# Altium footprint library SMT.PcbLib: 379 footprints (part 5 of 24)
Each footprint in its own frame and in the unit in brackets; x right, y up, seen from the top. Pads: shape width x height; smd on the part's side, far side on the other; paste and mask are expansions set on the pad; w line width, h text height; cw(c..) or ccw(c..) is an arc to the next point about the centre after c.
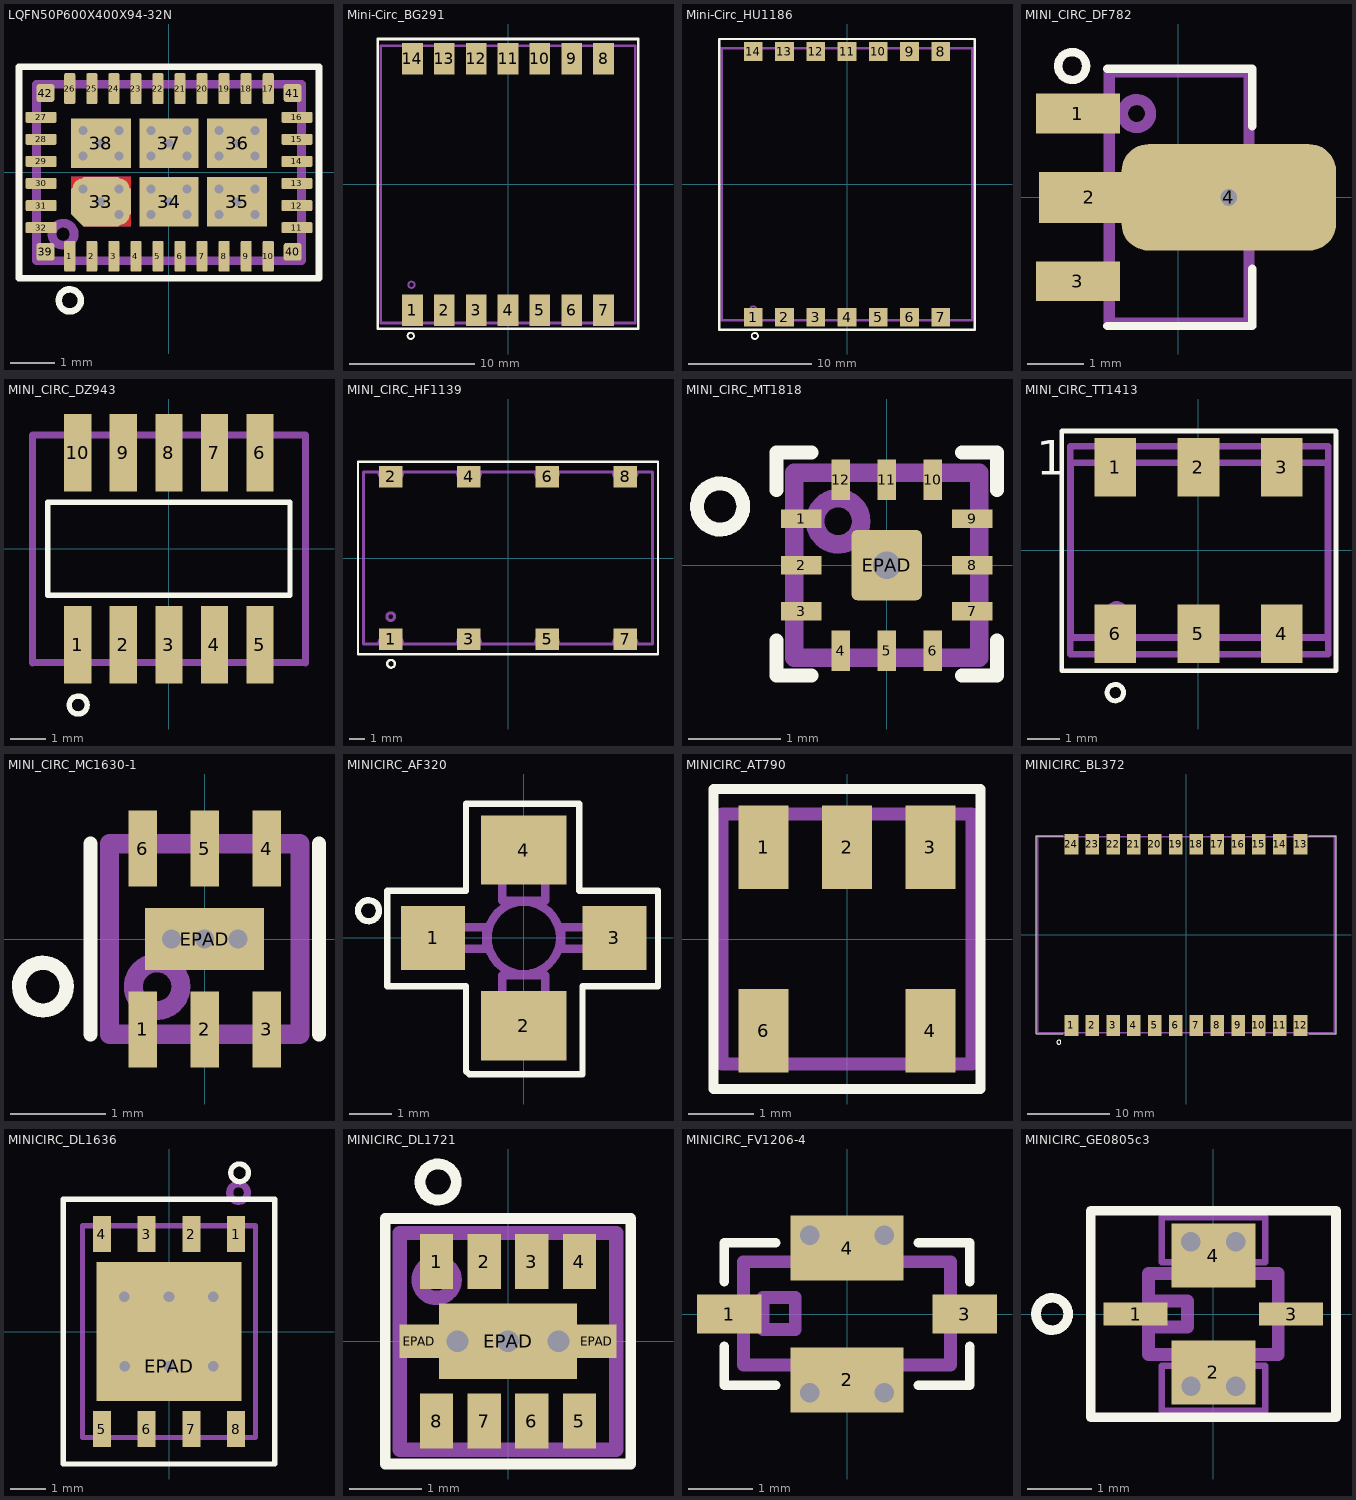
[diagram p4: the footprints below, top view; thin cyan lines are the x and y axes]

## LQFN50P600X400X94-32N [mm] "32-Lead SMD; Body: L=6mm, W=4mm, H=0.94mm; Weight: ~2g"
height 1.03
pads (42):
  rrect25% 0.25x0.7 smd paste+0 mask+0.05: 1(-2.25,-1.9) 2(-1.75,-1.9) 3(-1.25,-1.9) 4(-0.75,-1.9) 5(-0.25,-1.9) 6(0.25,-1.9) 7(0.75,-1.9) 8(1.25,-1.9) 9(1.75,-1.9) 10(2.25,-1.9) 17(2.25,1.9) 18(1.75,1.9) 19(1.25,1.9) 20(0.75,1.9) 21(0.25,1.9) 22(-0.25,1.9) 23(-0.75,1.9) 24(-1.25,1.9) 25(-1.75,1.9) 26(-2.25,1.9)
  rrect25% 0.7x0.25 smd paste+0 mask+0.05: 11(2.9,-1.25) 12(2.9,-0.75) 13(2.9,-0.25) 14(2.9,0.25) 15(2.9,0.75) 16(2.9,1.25) 27(-2.9,1.25) 28(-2.9,0.75) 29(-2.9,0.25) 30(-2.9,-0.25) 31(-2.9,-0.75) 32(-2.9,-1.25)
  oct 1.355x1.125 hole 0.2 paste+0 mask+0.04: 33(-1.543,-0.663)
  rect 1.33x1.125 hole 0.2 paste+0 mask+0.04: 34(0,-0.663) 37(0,0.663)
  rect 1.355x1.125 hole 0.2 paste+0 mask+0.04: 35(1.542,-0.663) 36(1.543,0.663) 38(-1.542,0.663)
  rrect25% 0.4x0.4 smd paste+0 mask+0.05: 39(-2.8,-1.8) 40(2.8,-1.8) 41(2.8,1.8) 42(-2.8,1.8)
via -1.95,0.95 diameter 0.48 hole 0.2
via -1.135,0.95 diameter 0.48 hole 0.2
via -1.135,0.375 diameter 0.48 hole 0.2
via -1.95,0.375 diameter 0.48 hole 0.2
via -0.408,0.375 diameter 0.48 hole 0.2
via 0.408,0.375 diameter 0.48 hole 0.2
via 0.408,0.95 diameter 0.48 hole 0.2
via -0.408,0.95 diameter 0.48 hole 0.2
via 1.135,0.375 diameter 0.48 hole 0.2
via 1.95,0.375 diameter 0.48 hole 0.2
via 1.95,0.95 diameter 0.48 hole 0.2
via 1.135,0.95 diameter 0.48 hole 0.2
via 1.135,-0.95 diameter 0.48 hole 0.2
via 1.95,-0.95 diameter 0.48 hole 0.2
via 1.95,-0.375 diameter 0.48 hole 0.2
via 1.135,-0.375 diameter 0.48 hole 0.2
via -0.408,-0.95 diameter 0.48 hole 0.2
via 0.408,-0.95 diameter 0.48 hole 0.2
via 0.408,-0.375 diameter 0.48 hole 0.2
via -0.408,-0.375 diameter 0.48 hole 0.2
via -1.135,-0.95 diameter 0.48 hole 0.2
via -1.135,-0.375 diameter 0.48 hole 0.2
via -1.95,-0.375 diameter 0.48 hole 0.2
Top Layer:
  region: -2.22,-0.945 -2.22,-0.1 -0.865,-0.1 -0.865,-1.225 -1.94,-1.225
Bottom Layer:
  region: -2.22,-0.945 -2.22,-0.1 -0.865,-0.1 -0.865,-1.225 -1.94,-1.225
  region: -2.22,-0.945 -2.22,-0.1 -0.865,-0.1 -0.865,-1.225 -1.94,-1.225
Top Overlay:
  circle w0.15: c-2.25,-2.9 r0.25
  lines w0.15: -3.4,-2.4 -3.4,2.4 3.4,2.4 3.4,-2.4 -3.4,-2.4
Top Paste:
  region: 0.87,0.1 0.865,0.105 0.865,1.225 2.22,1.225 2.22,0.1
  region: 0.87,-1.225 0.865,-1.22 0.865,-0.1 2.22,-0.1 2.22,-1.225
  region: -1.94,-1.225 -2.22,-0.945 -2.22,-0.1 -0.865,-0.1 -0.865,-1.225
  region: -0.665,1.225 0.665,1.225 0.665,0.1 -0.665,0.1
  region: -0.665,-0.1 0.665,-0.1 0.665,-1.225 -0.665,-1.225
  region: -2.215,0.1 -2.22,0.105 -2.22,1.225 -0.865,1.225 -0.865,0.1
Top Solder:
  region: -2.26,-0.965 -2.26,-0.06 -0.825,-0.06 -0.825,-1.265 -1.96,-1.265
Bottom Solder:
  region: -2.26,-0.965 -2.26,-0.06 -0.825,-0.06 -0.825,-1.265 -1.96,-1.265
Mechanical 1:
  circle w0.2: c-2.4,-1.4 r0.25
  lines w0.2: -3,-2 -3,2 3,2 3,-2 -3,-2
3D body "IC Body 3D LQFN50P600X400X94-32N.stp": height 1.04, standoff -0.01, extent -3.1,-2.1 3.1,2.1

## Mini-Circ_BG291 [mm] "SMD, 14-Leads, Body 20,32x22,1mm, Pitch 2,540mm, IPC Medium Density"
height 6.35
pads (14):
  rect 1.65x2.54 smd paste+0: 1(-7.62,-10.03) 2(-5.08,-10.03) 3(-2.54,-10.03) 4(0,-10.03) 5(2.54,-10.03) 6(5.08,-10.03) 7(7.62,-10.03) 8(7.62,10.03) 9(5.08,10.03) 10(2.54,10.03) 11(0,10.03) 12(-2.54,10.03) 13(-5.08,10.03) 14(-7.62,10.03)
Top Overlay:
  circle w0.15: c-7.755,-12.075 r0.25
  lines w0.2: -10.4,-11.5 -10.4,11.6 10.4,11.6 10.4,-11.5 -10.4,-11.5
Mechanical 1:
  circle w0.15: c-7.7,-8 r0.25
  lines w0.2: -10.16,-11.049 10.16,-11.049 10.16,11.049 -10.16,11.049 -10.16,-11.049
  text "Требуется прошивка, см. PDF" at -9.7,-13.8 h1.8
3D body "BG291.stp": height 6.3, standoff 0, extent -10.137,-11.025 10.263,11.075

## Mini-Circ_HU1186 [mil] "SMD, 14-Leads, Body 20,32x22,1mm, Pitch 2,540mm, IPC Medium Density"
height 250
pads (14):
  rect 60x60 smd paste+0: 1(-300,-425) 2(-200,-425) 3(-100,-425) 4(0,-425) 5(100,-425) 6(200,-425) 7(300,-425) 8(300,425) 9(200,425) 10(100,425) 11(0,425) 12(-100,425) 13(-200,425) 14(-300,425)
Top Overlay:
  circle w5.91: c-295,-485 r9.84
  lines w7.87: -409.45,-465 409.45,-465 409.45,465 -409.45,465 -409.45,-465
Mechanical 1:
  circle w5.91: c-300,-400 r9.84
  lines w7.87: -400,-435 -400,435 400,435 400,-435 -400,-435
Mechanical 20:
  text "Требуется прошивка, см. PDF" at -405,-20 h70.87
3D body "User Library-HU1186 pass.STEP": height 250.48, standoff 0.48, extent -400,-435.82 400,435.83

## MINI_CIRC_DF782 [mm] "SOT89, 3-Leads, Body 4,60x4,24mm, Pitch 1,50mm, Lead Span 4,0mm, IPC Medium Density"
height 1.6
pads (4):
  rect 1.499x0.711 smd mask+0.07: 1(-1.8,1.5) 3(-1.8,-1.5)
  rect 1.8x0.914 smd mask+0.07: 2(-1.6,0)
  rrect50% 3.835x1.905 hole 0.3: 4(0.9,0)
Top Overlay:
  circle w0.15: c-1.903,2.35 r0.25
  lines w0.15: -1.278,-2.3 1.322,-2.3 1.322,-1.275 ; -1.278,2.3 1.322,2.3 1.322,1.275
Top Paste:
  rectangle: 0.9,-0.6 2,0.6
Mechanical 1:
  circle w0.2: c-0.75,1.5 r0.25
  circle w0.2: c-0.75,1.5 r0.25
  lines w0.2: -1.24,-1.708 -2.14,-1.708 -2.14,-1.293 -1.24,-1.293 ; -1.24,-0.233 -2.14,-0.233 -2.14,0.232 -1.24,0.232 ; -1.24,1.292 -2.14,1.292 -2.14,1.707 -1.24,1.707 ; 1.26,-0.801 1.86,-0.801 1.86,0.799 1.26,0.799 ; -1.24,-2.251 1.26,-2.251 1.26,2.249 -1.24,2.249 -1.24,-2.251
Mechanical 20:
  text "Необходима прошивка, см. pdf" at -2.9,3 h1.2
3D body "SOT89.STEP": height 1.5, standoff -0.05, extent -2.125,-2.25 1.875,2.25

## MINI_CIRC_DZ943 [mil] "SMT frequency mixer small size 7.62x6.35x4.83"
height 190.16
pads (10):
  rect 30x85 smd: 1(-100,-105.5) 2(-50,-105.5) 3(0,-105.5) 4(50,-105.5) 5(100,-105.5) 6(100,105.5) 7(50,105.5) 8(0,105.5) 9(-50,105.5) 10(-100,105.5)
Top Overlay:
  circle w5.91: c-99.61,-171.65 r9.84
  lines w5.91: -132.87,-51.18 -132.87,51.18 133,51.18 133,-51.18 -132.87,-51.18
Mechanical 1:
  circle w7.87: c-99.41,-93.7 r9.84
  lines w7.87: -150,-125.39 -150,124.61 ; -149.8,-125 150.2,-125 ; -149.8,125 150.2,125 ; 150,-125.39 150,124.61
3D body "User Library-SCA-4-10.STEP": height 194.58, standoff 0.48, extent -149.99,-130.99 150.01,131

## MINI_CIRC_HF1139 [mil] "Filter 18.8X11.18X6.86mm"
height 270.08
pads (8):
  rect 60x55 smd: 1(-300,-207.5) 2(-300,207.5) 3(-100,-207.5) 4(-100,207.5) 5(100,-207.5) 6(100,207.5) 7(300,-207.5) 8(300,207.5)
Top Overlay:
  circle w5.91: c-299.21,-270.67 r9.84
  lines w5.91: -383.86,-246.06 383.86,-246.06 383.86,246.06 -383.86,246.06 -383.86,-246.06
Mechanical 1:
  circle w7.87: c-300,-150 r9.84
  lines w7.87: -370,-220 -370,220 -330,220 ccw(c-300,220) -270,220 -130,220 ccw(c-100,220) -70,220 70,220 ccw(c100,220) 130,220 270,220 ccw(c300,220) 330,220 370,220 370,-220 330,-220 ccw(c300,-220) 270,-220 130,-220 ccw(c100,-220) 70,-220 -70,-220 ccw(c-100,-220) -130,-220 -270,-220 ccw(c-300,-220) -330,-220 -370,-220
  text "MCL" at -330,70 h118.11
3D body "HF1139.STEP": height 270.08, standoff 0, extent -370.08,-220.67 370.08,219.49

## MINI_CIRC_MT1818 [mm] "MT1818, 12-Leads, Body 3.00x3.00mm, Pitch 0.50mm, Thermal Pad 0.76x0.76mm"
height 0.55
pads (13):
  rect 0.44x0.2 smd mask+0.1: 1(-0.925,0.5) 2(-0.925,0) 3(-0.925,-0.5) 7(0.925,-0.5) 8(0.925,0) 9(0.925,0.5)
  rect 0.2x0.44 smd mask+0.1: 4(-0.5,-0.925) 5(0,-0.925) 6(0.5,-0.925) 10(0.5,0.925) 11(0,0.925) 12(-0.5,0.925)
  rrect15% 0.76x0.76 hole 0.3: EPAD(0,0)
Top Overlay:
  circle w0.15: c-1.803,0.635 r0.25
  lines w0.15: -1.194,-0.813 -1.194,-1.194 -0.813,-1.194 ; -1.194,0.813 -1.194,1.219 -0.813,1.219 ; 0.813,-1.194 1.194,-1.194 1.194,-0.813 ; 0.813,1.219 1.194,1.219 1.194,0.813
Top Paste:
  rectangle: -0.25,-0.25 0.25,0.25
Mechanical 1:
  circle w0.2: c-0.525,0.475 r0.25
  lines w0.2: -1,-1 -1,1 1,1 1,-1 -1,-1
3D body "MT1818.STEP": height 0.55, standoff 0, extent -1,-1 1,1

## MINI_CIRC_TT1413 [mm] "SMT 7.87X6.35X5.08mm"
height 5.08
pads (6):
  rect 1.27x1.78 smd: 1(-2.54,2.54) 2(0,2.54) 3(2.54,2.54) 4(2.54,-2.54) 5(0,-2.54) 6(-2.54,-2.54)
Top Overlay:
  circle w0.15: c-2.54,-4.343 r0.25
  lines w0.15: -4.175,-3.675 -4.175,3.65 4.2,3.65 4.2,-3.675 -4.175,-3.675
  text "1" at -4.962,1.965 h1.8
Mechanical 1:
  circle w0.2: c-2.494,-1.899 r0.25
  lines w0.2: -3.91,-3.165 -3.91,3.185 -3.021,3.185 ccw(c-2.515,3.2) -2.009,3.185 -0.481,3.185 ccw(c0.025,3.2) 0.531,3.185 2.059,3.185 ccw(c2.565,3.2) 3.071,3.185 3.96,3.185 3.96,-3.165 3.071,-3.165 ccw(c2.565,-3.177) 2.059,-3.165 0.531,-3.165 ccw(c0.025,-3.177) -0.481,-3.165 -2.009,-3.165 ccw(c-2.515,-3.177) -3.021,-3.165 -3.91,-3.165 ; -3.894,-2.659 -3.894,2.68 3.945,2.68 3.945,-2.659 -3.894,-2.659
Mechanical 20:
  text "см. pdf" at -1.5,-1 h1.5
  text "Требуется прошивка," at -5.5,0.5 h1.5
3D body "User Library-RLM 751.STEP": height 4.09, standoff -0.03, extent -3.935,-3.175 3.935,3.175

## MINI_CIRC_МС1630-1 [mm] "6-Leads, Body 2.00x2.00 mm, Pitch 0.65 mm, Thermal Pad 0.65X1.25 mm"
height 1
pads (7):
  rect 0.3x0.8 smd mask+0.05: 1(-0.65,-0.95) 2(0,-0.95) 3(0.65,-0.95) 4(0.65,0.95) 5(0,0.95) 6(-0.65,0.95)
  rect 1.25x0.65 hole 0.2 mask+0.05: EPAD(0,0)
via -0.35,0 diameter 0.45 hole 0.2
via 0.35,0 diameter 0.45 hole 0.2
Top Overlay:
  lines w0.15: -1.45,-0.5 cw(c-1.7,-0.5) -1.45,-0.492 ; -1.2,-1 -1.2,1 ; 1.2,-1 1.2,1
Top Paste:
  region: -0.575,-0.275 -0.575,0.275 0.575,0.275 0.575,-0.275
Mechanical 1:
  circle w0.2: c-0.5,-0.5 r0.25
  lines w0.2: -1,-1 -1,1 1,1 1,-1 -1,-1
Mechanical 20:
  text "Требуется прошивка / см.datasheet, отв. plugged" at -2.7,-1.95 h1
3D body "МС1630.stp": height 1, standoff -0.05, extent -1,-1 1,1

## MINICIRC_AF320 [mil] "Miniature size 5.08x5.08x1.45"
height 57.09
pads (4):
  rect 60x60 smd: 1(-85.04,0) 3(85.04,0)
  rect 80x65 smd: 2(0,-82.48) 4(0,82.48)
Top Overlay:
  circle w5.91: c-145.67,25.59 r9.84
  lines w5.91: -127.95,-45.28 -127.95,44.29 -54.13,44.29 -54.13,125.98 52.17,125.98 52.17,44.29 125.98,44.29 125.98,-45.28 55.12,-45.28 55.12,-127.95 -51.18,-127.95 -54.13,-125 -54.13,-45.28 -127.95,-45.28
Mechanical 1:
  circle w7.87: c0,0 r34.06
  lines w7.87: -80,10 -35.04,10.04 ; -80,10.04 -100,-10.04 -35.04,-10.04 -35.04,10 ; 98.82,-10.04 35.04,-10.04 35.04,10.04 98.82,10.04 ; 100,-8.86 100,8.86 ; -20.08,-100 20.08,-100 20.08,-35.04 -20.08,-35.04 -20.08,-100 ; -20.08,35.04 20.08,35.04 20.08,100 -20.08,100 -20.08,35.04
3D body "PAT-1+.stp": height 57.2, standoff 0, extent -99.99,-99.99 100.01,100.01

## MINICIRC_AT790 [mil]
height 150
pads (5):
  rect 30x50 smd: 1(-50,55) 2(0,55) 3(50,55) 4(50,-55) 6(-50,-55)
Top Overlay:
  lines w5.91: -80,-90 80,-90 80,90 -80,90 -80,-90
Mechanical 1:
  lines w7.87: -75,-75 75,-75 75,75 -75,75 -75,-75
3D body "AT790.stp": height 110.5, standoff 0.5, extent -75,-75 75,75

## MINICIRC_BL372 [mil]
height 250
pads (24):
  rect 65x100 smd: 1(-550,-435) 2(-450,-435) 3(-350,-435) 4(-250,-435) 5(-150,-435) 6(-50,-435) 7(50,-435) 8(150,-435) 9(250,-435) 10(350,-435) 11(450,-435) 12(550,-435) 13(550,435) 14(450,435) 15(350,435) 16(250,435) 17(150,435) 18(50,435) 19(-50,435) 20(-150,435) 21(-250,435) 22(-350,435) 23(-450,435) 24(-550,435)
Top Overlay:
  circle w5.91: c-610.24,-515.75 r9.84
  lines w5.91: -590.55,-476.38 -720.47,-476.38 -720.47,476.38 -590.55,476.38 ; 590.55,-476.38 720.47,-476.38 720.47,476.38 590.55,476.38
Mechanical 1:
  circle w7.87: c-550,-435 r9.84
  lines w7.87: -713,-470 713,-470 713,470 -713,470 -713,-470
Mechanical 20:
  text "Требуется прошивка / см.datasheet" at -255.91,-43.31 h60
3D body: height 250, standoff 0, extent -713,-470 713,470

## MINICIRC_DL1636 [mm] "8-Leads, Body 4,9x6mm, Pitch 1,27 mm, Thermal Pad 4,11x3,94mm, IPC Medium Density"
height 0.9
pads (9):
  rect 0.51x1.02 smd mask+0.05: 1(1.905,2.76) 2(0.635,2.76) 3(-0.635,2.76) 4(-1.905,2.76) 5(-1.905,-2.76) 6(-0.635,-2.76) 7(0.635,-2.76) 8(1.905,-2.76)
  rect 4.11x3.94 hole 0.3 copper offset 0,0.985 mask+0.05: EPAD(0,-0.985)
via 1.25,-0.985 diameter 0.6 hole 0.3
via -1.25,-0.985 diameter 0.6 hole 0.3
via -1.27,0.985 diameter 0.6 hole 0.3
via 1.25,0.985 diameter 0.6 hole 0.3
via 0,0.985 diameter 0.6 hole 0.3
Top Overlay:
  circle w0.15: c2,4.5 r0.25
  lines w0.15: -3,-3.75 2.25,-3.75 3,-3.75 3,3.75 -2.25,3.75 -3,3.75 -3,-3.75
Top Paste:
  region: 1.75,-1.5 1.75,1.5 -1.75,1.5 -1.75,-1.5
Mechanical 1:
  circle w0.2: c1.97,3.94 r0.25
  lines w0.15: -2.45,-3 2.45,-3 2.45,3 -2.45,3 -2.45,-3
3D body "PSON127P600X90_HS-9N.step": height 0.9, standoff 0, extent -2.45,-3.001 2.45,3.001

## MINICIRC_DL1721 [mm] "Monolithic Amplifier 50 ? 0.05 to 4 GHz"
height 1.14
pads (11):
  rect 0.46x0.76 smd mask+0.04: 1(-0.99,1.105) 2(-0.33,1.105) 3(0.33,1.105) 4(0.99,1.105) 5(0.99,-1.105) 6(0.33,-1.105) 7(-0.33,-1.105) 8(-0.99,-1.105)
  rect 0.545x0.46 smd mask+0.04: EPAD(-1.228,0) EPAD(1.228,0)
  rect 1.91x1.04 smd mask+0.04: EPAD(0,0)
via -0.7,0 diameter 0.6 hole 0.3
via 0.7,0 diameter 0.6 hole 0.3
via 0,0 diameter 0.6 hole 0.3
Top Overlay:
  circle w0.15: c-0.968,2.206 r0.25
  lines w0.15: -1.7,-1.7 1.7,-1.7 1.7,1.7 -1.7,1.7 -1.7,-1.7
Mechanical 1:
  circle w0.2: c-0.99,0.85 r0.25
  lines w0.2: -1.5,-1.5 -1.5,1.5 1.5,1.5 1.5,-1.5 -1.5,-1.5
3D body "DL1721.stp": height 1.14, standoff 0, extent -1.5,-1.5 1.5,1.5

## MINICIRC_FV1206-4 [mm] "High Pass Filter Small size 3.2mm x 1.6 mm"
height 1.05
pads (4):
  rect 1x0.61 smd paste-0.1 mask+0.05: 1(-1.82,0) 3(1.82,0)
  rect 1.75x1 smd paste-0.1 mask+0.05: 2(0,-1.02) 4(0,1.02)
via -0.575,-1.22 diameter 0.6 hole 0.3
via 0.575,-1.22 diameter 0.6 hole 0.3
via 0.575,1.22 diameter 0.6 hole 0.3
via -0.575,1.22 diameter 0.6 hole 0.3
Top Overlay:
  lines w0.15: -1.9,-0.5 -1.9,-1.1 -1.1,-1.1 ; -1.9,0.5 -1.9,1.1 -1.1,1.1 ; 1.1,-1.1 1.9,-1.1 1.9,-0.5 ; 1.1,1.1 1.9,1.1 1.9,0.5
Mechanical 1:
  lines w0.2: -1.6,-0.792 1.6,-0.792 1.6,0.808 -1.6,0.808 -1.6,-0.792 ; -1.3,-0.242 -0.8,-0.242 -0.8,0.258 -1.3,0.258 -1.3,-0.242
Mechanical 20:
  text "Требуется прошивка, / см.PDF. / Отв. должны быть / PLUGGED" at -2.8,-4.7 h1.8
3D body "FV1206-4.stp": height 1.11, standoff 0.01, extent -1.6,-0.792 1.7,0.908

## MINICIRC_GE0805c3 [mm] "Filter 1.25x2.01x1,04, 4 pin"
height 1.04
pads (4):
  rect 0.99x0.36 smd paste-0.03 mask+0.05: 1(-1.205,0) 3(1.205,0)
  rect 1.3x0.99 smd paste-5 mask+0.05: 2(0,-0.905) 4(0,0.905)
via 0.348,-1.118 diameter 0.55 hole 0.3
via -0.348,-1.119 diameter 0.55 hole 0.3
via -0.35,1.12 diameter 0.55 hole 0.3
via 0.348,1.119 diameter 0.55 hole 0.3
Top Overlay:
  circle w0.15: c-2.5,0 r0.25
  lines w0.15: -1.9,-1.6 -1.9,1.6 -1.8,1.6 1.9,1.6 1.9,-1.6 -1.9,-1.6
Top Paste:
  region: -0.65,0.41 0.65,0.41 0.65,0.905 -0.65,0.905
  region: 0.65,-0.41 -0.65,-0.41 -0.65,-0.905 0.65,-0.905
Mechanical 1:
  lines w0.2: -1.005,-0.2 -0.4,-0.2 -0.4,0.2 -1.005,0.2 ; -1.005,-0.625 -1.005,0.625 1.005,0.625 1.005,-0.625 -1.005,-0.625
Mechanical 5:
  lines w0.1: -0.8,-1.5 0.8,-1.5 0.8,-0.8 -0.8,-0.8 -0.8,-1.5 ; -0.8,0.8 -0.8,1.5 0.8,1.5 0.8,0.8 -0.8,0.8
Mechanical 20:
  text "Рекомендуется /  plugged PTH (слой Mech5)" at -3.6,1.8 h1.2
3D body "GE0805C3.stp": height 0.96, standoff 0.01, extent -1,-0.625 1,0.625